# Altium footprint library domino-rising-cage-clamp.PcbLib: 435 footprints (part 10 of 28)
Each footprint in its own frame and in the unit in brackets; x right, y up, seen from the top. Pads: shape width x height; smd on the part's side, far side on the other; paste and mask are expansions set on the pad; w line width, h text height; cw(c..) or ccw(c..) is an arc to the next point about the centre after c.
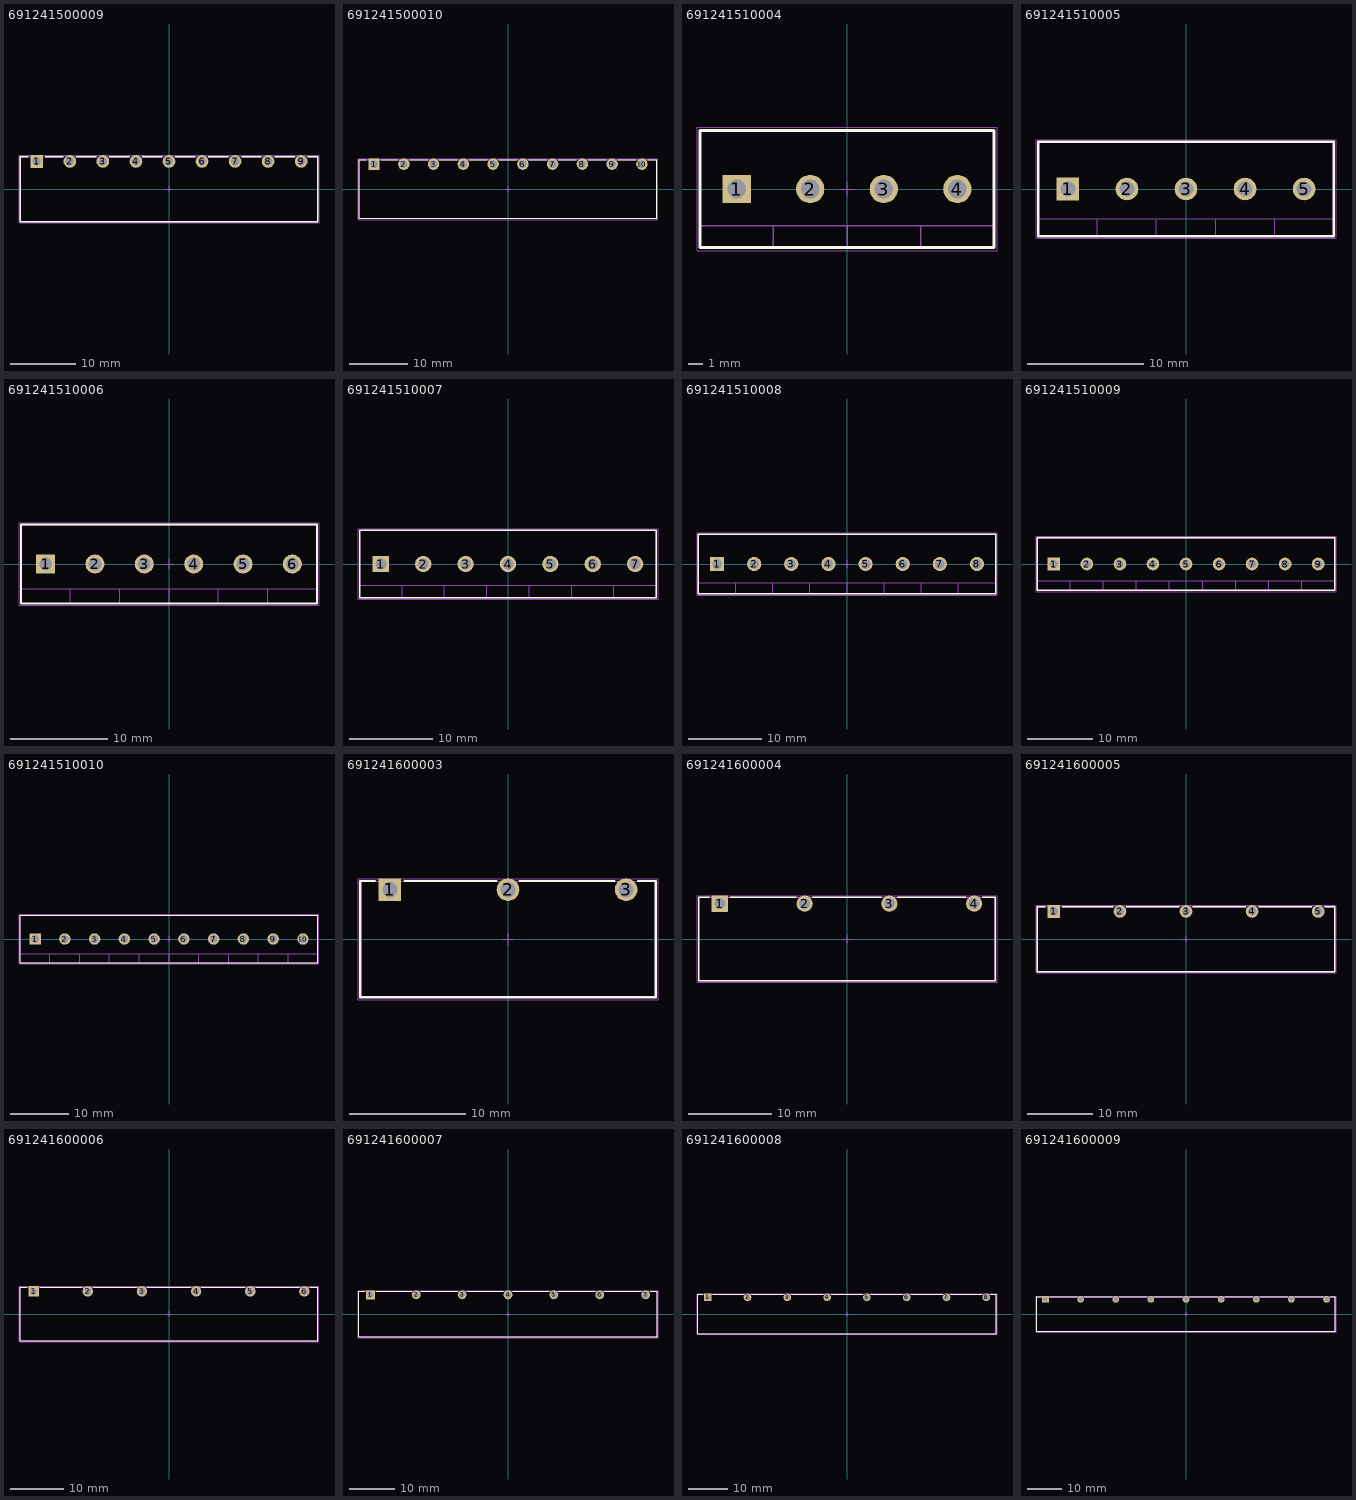
[diagram p9: the footprints below, top view; thin cyan lines are the x and y axes]

## 691241500009 [mm] "Serie 2415-5.08mm Vertical Cable Entry with Rising Cage Clamp, 9 pins"
height 8.1
pads (9):
  rect 1.95x1.95 hole 1.3: 1(-20.325,4.25)
  round 1.95 hole 1.3: 2(-15.245,4.25) 3(-10.165,4.25) 4(-5.085,4.25) 5(-0.005,4.25) 6(5.075,4.25) 7(10.155,4.25) 8(15.235,4.25) 9(20.315,4.25)
Top Overlay:
  lines w0.2: -21.61,5 -22.86,5 -22.86,-5 22.86,-5 22.86,5 21.31,5 ; -19.06,5 -16.26,5 ; -14.23,5 -11.16,5 ; -9.17,5 -6.1,5 ; -4.09,5 -1.02,5 ; 0.99,5 4.06,5 ; 6.07,5 9.14,5 ; 11.15,5 14.22,5 ; 16.23,5 19.3,5
Mechanical 13:
  lines w0.1: -22.86,-5 -22.86,5 22.86,5 22.86,-5 -22.86,-5
Mechanical 15:
  lines w0.05: -0.5,0 0.5,0 ; 0,-0.5 0,0.5 ; -23.06,-5.2 23.06,-5.2 23.06,5.2 -23.06,5.2 -23.06,-5.2
3D body "691241500009.stp": height 8.2, standoff -3.4, extent -22.865,-5 22.855,5

## 691241500010 [mm] "Serie 2415-5.08mm Vertical Cable Entry with Rising Cage Clamp, 10 pins"
height 8.1
pads (10):
  rect 1.95x1.95 hole 1.3: 1(-22.865,4.25)
  round 1.95 hole 1.3: 2(-17.785,4.25) 3(-12.705,4.25) 4(-7.625,4.25) 5(-2.545,4.25) 6(2.535,4.25) 7(7.615,4.25) 8(12.695,4.25) 9(17.775,4.25) 10(22.855,4.25)
Top Overlay:
  lines w0.2: -24.15,5 -25.4,5 -25.4,-5 25.4,-5 25.4,5 23.85,5 ; -21.6,5 -18.8,5 ; -16.77,5 -13.7,5 ; -11.71,5 -8.64,5 ; -6.63,5 -3.56,5 ; -1.55,5 1.52,5 ; 3.53,5 6.6,5 ; 8.61,5 11.68,5 ; 13.69,5 16.76,5 ; 18.77,5 21.84,5
Mechanical 13:
  lines w0.1: -25.4,-5 25.4,-5 25.4,5 -25.4,5 -25.4,-5
Mechanical 15:
  lines w0.05: -0.5,0 0.5,0 ; 0,-0.5 0,0.5 ; -25.6,-5.2 -25.6,5.2 25.6,5.2 25.6,-5.2 -25.6,-5.2
3D body "691241500010.stp": height 8.2, standoff -3.4, extent -25.405,-5 25.395,5

## 691241510004 [mm] "Serie 2415 - 5.08 mm _ 4 pins"
height 10
pads (4):
  rect 1.95x1.95 hole 1.3: 1(-7.62,0)
  round 1.95 hole 1.3: 2(-2.54,0) 3(2.54,0) 4(7.62,0)
Top Overlay:
  lines w0.2: -10.16,-4.05 -10.16,4.05 10.16,4.05 10.16,-4.05 -10.16,-4.05
Mechanical 13:
  lines w0.1: -10.16,-2.55 10.16,-2.55 ; -5.08,-4.05 -5.08,-2.55 ; 0,-4.05 0,-2.55 ; 5.08,-4.05 5.08,-2.55 ; -10.16,-4.05 10.16,-4.05 10.16,4.05 -10.16,4.05 -10.16,-4.05
Mechanical 15:
  lines w0.05: -0.5,0 0.5,0 ; 0,-0.5 0,0.5 ; -10.36,-4.25 -10.36,4.25 10.36,4.25 10.36,-4.25 -10.36,-4.25
3D body "691241510004.stp": height 10.05, standoff -3.45, extent -10.16,-4.05 10.16,4.05

## 691241510005 [mm] "Serie 2415 - 5.08 mm _ 5 pins"
height 10
pads (5):
  rect 1.95x1.95 hole 1.3: 1(-10.16,0)
  round 1.95 hole 1.3: 2(-5.08,0) 3(0,0) 4(5.08,0) 5(10.16,0)
Top Overlay:
  lines w0.2: -12.7,-4.05 12.7,-4.05 12.7,4.05 -12.7,4.05 -12.7,-4.05
Mechanical 13:
  lines w0.1: -12.7,-2.55 12.7,-2.55 ; -7.62,-4.05 -7.62,-2.55 ; -2.54,-4.05 -2.54,-2.55 ; 2.54,-4.05 2.54,-2.55 ; 7.62,-4.05 7.62,-2.55 ; -12.7,-4.05 -12.7,4.05 12.7,4.05 12.7,-4.05 -12.7,-4.05
Mechanical 15:
  lines w0.05: -0.5,0 0.5,0 ; 0,-0.5 0,0.5 ; -12.9,-4.25 12.9,-4.25 12.9,4.25 -12.9,4.25 -12.9,-4.25
3D body "691241510005.stp": height 10.05, standoff -3.45, extent -12.7,-4.05 12.7,4.05

## 691241510006 [mm] "Serie 2415 - 5.08 mm _ 6 pins"
height 10
pads (6):
  rect 1.95x1.95 hole 1.3: 1(-12.7,0)
  round 1.95 hole 1.3: 2(-7.62,0) 3(-2.54,0) 4(2.54,0) 5(7.62,0) 6(12.7,0)
Top Overlay:
  lines w0.2: -15.24,-4.05 -15.24,4.05 15.24,4.05 15.24,-4.05 -15.24,-4.05
Mechanical 13:
  lines w0.1: -15.24,-2.55 15.24,-2.55 ; -10.16,-4.05 -10.16,-2.55 ; -5.08,-4.05 -5.08,-2.55 ; 0,-4.05 0,-2.55 ; 5.08,-4.05 5.08,-2.55 ; 10.16,-4.04 10.16,-2.54 ; -15.24,-4.05 15.24,-4.05 15.24,4.05 -15.24,4.05 -15.24,-4.05
Mechanical 15:
  lines w0.05: -0.5,0 0.5,0 ; 0,-0.5 0,0.5 ; -15.44,-4.25 -15.44,4.25 15.44,4.25 15.44,-4.25 -15.44,-4.25
3D body "691241510006.stp": height 10.05, standoff -3.45, extent -15.24,-4.05 15.24,4.05

## 691241510007 [mm] "Serie 2415 - 5.08 mm _ 7 pins"
height 10
pads (7):
  rect 1.95x1.95 hole 1.3: 1(-15.24,0)
  round 1.95 hole 1.3: 2(-10.16,0) 3(-5.08,0) 4(0,0) 5(5.08,0) 6(10.16,0) 7(15.24,0)
Top Overlay:
  lines w0.2: -17.78,-4.05 17.78,-4.05 17.78,4.05 -17.78,4.05 -17.78,-4.05
Mechanical 13:
  lines w0.1: -17.78,-2.55 17.78,-2.55 ; -12.7,-4.05 -12.7,-2.55 ; -7.62,-4.05 -7.62,-2.55 ; -2.54,-4.05 -2.54,-2.55 ; 2.54,-4.05 2.54,-2.55 ; 7.62,-4.04 7.62,-2.54 ; 12.7,-4.04 12.7,-2.54 ; -17.78,-4.05 -17.78,4.05 17.78,4.05 17.78,-4.05 -17.78,-4.05
Mechanical 15:
  lines w0.05: -0.5,0 0.5,0 ; 0,-0.5 0,0.5 ; -17.98,-4.25 17.98,-4.25 17.98,4.25 -17.98,4.25 -17.98,-4.25
3D body "691241510007.stp": height 10.05, standoff -3.45, extent -17.78,-4.05 17.78,4.05

## 691241510008 [mm] "Serie 2415 - 5.08 mm _ 8 pins"
height 10
pads (8):
  rect 1.95x1.95 hole 1.3: 1(-17.78,0)
  round 1.95 hole 1.3: 2(-12.7,0) 3(-7.62,0) 4(-2.54,0) 5(2.54,0) 6(7.62,0) 7(12.7,0) 8(17.78,0)
Top Overlay:
  lines w0.2: -20.32,-4.05 -20.32,4.05 20.32,4.05 20.32,-4.05 -20.32,-4.05
Mechanical 13:
  lines w0.1: -20.32,-2.55 20.32,-2.55 ; -15.24,-4.05 -15.24,-2.55 ; -10.16,-4.05 -10.16,-2.55 ; -5.08,-4.05 -5.08,-2.55 ; 0,-4.05 0,-2.55 ; 5.08,-4.04 5.08,-2.54 ; 10.16,-4.04 10.16,-2.54 ; 15.24,-4.04 15.24,-2.54 ; -20.32,-4.05 20.32,-4.05 20.32,4.05 -20.32,4.05 -20.32,-4.05
Mechanical 15:
  lines w0.05: -0.5,0 0.5,0 ; 0,-0.5 0,0.5 ; -20.52,-4.25 -20.52,4.25 20.52,4.25 20.52,-4.25 -20.52,-4.25
3D body "691241510008.stp": height 10.05, standoff -3.45, extent -20.32,-4.05 20.32,4.05

## 691241510009 [mm] "Serie 2415 - 5.08 mm _ 9 pins"
height 10
pads (9):
  rect 1.95x1.95 hole 1.3: 1(-20.32,0)
  round 1.95 hole 1.3: 2(-15.24,0) 3(-10.16,0) 4(-5.08,0) 5(0,0) 6(5.08,0) 7(10.16,0) 8(15.24,0) 9(20.32,0)
Top Overlay:
  lines w0.2: -22.86,-4.05 22.86,-4.05 22.86,4.05 -22.86,4.05 -22.86,-4.05
Mechanical 13:
  lines w0.1: -22.86,-2.55 22.86,-2.55 ; -17.78,-4.05 -17.78,-2.55 ; -12.7,-4.05 -12.7,-2.55 ; -7.62,-4.05 -7.62,-2.55 ; -2.54,-4.05 -2.54,-2.55 ; 2.54,-4.04 2.54,-2.54 ; 7.62,-4.04 7.62,-2.54 ; 12.7,-4.04 12.7,-2.54 ; 17.78,-4.04 17.78,-2.54 ; -22.86,-4.05 -22.86,4.05 22.86,4.05 22.86,-4.05 -22.86,-4.05
Mechanical 15:
  lines w0.05: -0.5,0 0.5,0 ; 0,-0.5 0,0.5 ; -23.06,-4.25 23.06,-4.25 23.06,4.25 -23.06,4.25 -23.06,-4.25
3D body "691241510009.stp": height 10.05, standoff -3.45, extent -22.86,-4.05 22.86,4.05

## 691241510010 [mm] "Serie 2415 - 5.08 mm _ 10 pins"
height 10
pads (10):
  rect 1.95x1.95 hole 1.3: 1(-22.86,0)
  round 1.95 hole 1.3: 2(-17.78,0) 3(-12.7,0) 4(-7.62,0) 5(-2.54,0) 6(2.54,0) 7(7.62,0) 8(12.7,0) 9(17.78,0) 10(22.86,0)
Top Overlay:
  lines w0.2: -25.4,-4.05 -25.4,4.05 25.4,4.05 25.4,-4.05 -25.4,-4.05
Mechanical 13:
  lines w0.1: -25.4,-2.55 25.4,-2.55 ; -20.32,-4.05 -20.32,-2.55 ; -15.24,-4.05 -15.24,-2.55 ; -10.16,-4.05 -10.16,-2.55 ; -5.08,-4.05 -5.08,-2.55 ; 0,-4.04 0,-2.54 ; 5.08,-4.04 5.08,-2.54 ; 10.16,-4.04 10.16,-2.54 ; 15.24,-4.04 15.24,-2.54 ; 20.32,-4.04 20.32,-2.54 ; -25.4,-4.05 25.4,-4.05 25.4,4.05 -25.4,4.05 -25.4,-4.05
Mechanical 15:
  lines w0.05: -0.5,0 0.5,0 ; 0,-0.5 0,0.5 ; -25.6,-4.25 -25.6,4.25 25.6,4.25 25.6,-4.25 -25.6,-4.25
3D body "691241510010.stp": height 10.05, standoff -3.45, extent -25.4,-4.05 25.4,4.05

## 691241600003 [mm] "Vertical Cable Entry with Rising Cage Clamp, pitch 10.16mm, 03p"
height 8.1
pads (3):
  rect 1.95x1.95 hole 1.3: 1(-10.16,4.25)
  round 1.95 hole 1.3: 2(0,4.25) 3(10.16,4.25)
Top Overlay:
  lines w0.2: -11.45,5 -12.7,5 -12.7,-5 12.7,-5 12.7,5 11.2,5 ; -8.9,5 -1,5 ; 1,5 9.15,5
Mechanical 13:
  lines w0.1: -12.7,-5 12.7,-5 12.7,5 -12.7,5 -12.7,-5
Mechanical 15:
  lines w0.05: -0.5,0 0.5,0 ; 0,-0.5 0,0.5 ; -12.9,-5.2 12.9,-5.2 12.9,5.2 -12.9,5.2 -12.9,-5.2
3D body "691241600003.stp": height 8.2, standoff -3.4, extent -12.7,-5 12.7,5

## 691241600004 [mm] "Vertical Cable Entry with Rising Cage Clamp, pitch 10.16mm, 04p"
height 8.1
pads (4):
  rect 1.95x1.95 hole 1.3: 1(-15.24,4.25)
  round 1.95 hole 1.3: 2(-5.08,4.25) 3(5.08,4.25) 4(15.24,4.25)
Top Overlay:
  lines w0.2: -16.53,5 -17.78,5 -17.78,-5 17.78,-5 17.78,5 16.28,5 ; -13.98,5 -6.08,5 ; -4.08,5 4.07,5 ; 6.08,5 14.23,5
Mechanical 13:
  lines w0.1: -17.78,-5 -17.78,5 17.78,5 17.78,-5 -17.78,-5
Mechanical 15:
  lines w0.05: -0.5,0 0.5,0 ; 0,-0.5 0,0.5 ; -17.98,-5.2 -17.98,5.2 17.98,5.2 17.98,-5.2 -17.98,-5.2
3D body "691241600004.stp": height 8.2, standoff -3.4, extent -17.78,-5 17.78,5

## 691241600005 [mm] "Vertical Cable Entry with Rising Cage Clamp, pitch 10.16mm, 05p"
height 8.1
pads (5):
  rect 1.95x1.95 hole 1.3: 1(-20.32,4.25)
  round 1.95 hole 1.3: 2(-10.16,4.25) 3(0,4.25) 4(10.16,4.25) 5(20.32,4.25)
Top Overlay:
  lines w0.2: -21.61,5 -22.86,5 -22.86,-5 22.86,-5 22.86,5 21.36,5 ; -19.06,5 -11.16,5 ; -9.16,5 -1.01,5 ; 1,5 9.15,5 ; 11.16,5 19.31,5
Mechanical 13:
  lines w0.1: -22.86,-5 22.86,-5 22.86,5 -22.86,5 -22.86,-5
Mechanical 15:
  lines w0.05: -0.5,0 0.5,0 ; 0,-0.5 0,0.5 ; -23.06,-5.2 23.06,-5.2 23.06,5.2 -23.06,5.2 -23.06,-5.2
3D body "691241600005.stp": height 8.2, standoff -3.4, extent -22.86,-5 22.86,5

## 691241600006 [mm] "Vertical Cable Entry with Rising Cage Clamp, pitch 10.16mm, 06p"
height 8.1
pads (6):
  rect 1.95x1.95 hole 1.3: 1(-25.4,4.25)
  round 1.95 hole 1.3: 2(-15.24,4.25) 3(-5.08,4.25) 4(5.08,4.25) 5(15.24,4.25) 6(25.4,4.25)
Top Overlay:
  lines w0.2: -26.69,5 -27.94,5 -27.94,-5 27.94,-5 27.94,5 26.44,5 ; -24.14,5 -16.24,5 ; -14.24,5 -6.09,5 ; -4.08,5 4.07,5 ; 6.08,5 14.23,5 ; 16.24,5 24.39,5
Mechanical 13:
  lines w0.1: -27.94,-5 27.94,-5 27.94,5 -27.94,5 -27.94,-5
Mechanical 15:
  lines w0.05: -0.5,0 0.5,0 ; 0,-0.5 0,0.5 ; -28.14,-5.2 28.14,-5.2 28.14,5.2 -28.14,5.2 -28.14,-5.2
3D body "691241600006.stp": height 8.2, standoff -3.4, extent -27.94,-5 27.94,5

## 691241600007 [mm] "Vertical Cable Entry with Rising Cage Clamp, pitch 10.16mm, 07p"
height 8.1
pads (7):
  rect 1.95x1.95 hole 1.3: 1(-30.48,4.25)
  round 1.95 hole 1.3: 2(-20.32,4.25) 3(-10.16,4.25) 4(0,4.25) 5(10.16,4.25) 6(20.32,4.25) 7(30.48,4.25)
Top Overlay:
  lines w0.2: -31.77,5 -33.02,5 -33.02,-5 33.02,-5 33.02,5 31.52,5 ; -29.22,5 -21.32,5 ; -19.32,5 -11.17,5 ; -9.16,5 -1.01,5 ; 1,5 9.15,5 ; 11.16,5 19.31,5 ; 21.32,5 29.47,5
Mechanical 13:
  lines w0.1: -33.02,-5 -33.02,5 33.02,5 33.02,-5 -33.02,-5
Mechanical 15:
  lines w0.05: -0.5,0 0.5,0 ; 0,-0.5 0,0.5 ; -33.22,-5.2 -33.22,5.2 33.22,5.2 33.22,-5.2 -33.22,-5.2
3D body "691241600007.stp": height 8.2, standoff -3.4, extent -33.02,-5 33.02,5

## 691241600008 [mm] "Vertical Cable Entry with Rising Cage Clamp, pitch 10.16mm, 08p"
height 8.1
pads (8):
  rect 1.95x1.95 hole 1.3: 1(-35.56,4.25)
  round 1.95 hole 1.3: 2(-25.4,4.25) 3(-15.24,4.25) 4(-5.08,4.25) 5(5.08,4.25) 6(15.24,4.25) 7(25.4,4.25) 8(35.56,4.25)
Top Overlay:
  lines w0.2: -36.85,5 -38.1,5 -38.1,-5 38.1,-5 38.1,5 36.6,5 ; -34.3,5 -26.4,5 ; -24.4,5 -16.25,5 ; -14.24,5 -6.09,5 ; -4.08,5 4.07,5 ; 6.08,5 14.23,5 ; 16.24,5 24.39,5 ; 26.4,5 34.55,5
Mechanical 13:
  lines w0.1: -38.1,-5 38.1,-5 38.1,5 -38.1,5 -38.1,-5
Mechanical 15:
  lines w0.05: -0.5,0 0.5,0 ; 0,-0.5 0,0.5 ; -38.3,-5.2 38.3,-5.2 38.3,5.2 -38.3,5.2 -38.3,-5.2
3D body "691241600008.stp": height 8.2, standoff -3.4, extent -38.1,-5 38.1,5

## 691241600009 [mm] "Vertical Cable Entry with Rising Cage Clamp, pitch 10.16mm, 09p"
height 8.1
pads (9):
  rect 1.95x1.95 hole 1.3: 1(-40.64,4.25)
  round 1.95 hole 1.3: 2(-30.48,4.25) 3(-20.32,4.25) 4(-10.16,4.25) 5(0,4.25) 6(10.16,4.25) 7(20.32,4.25) 8(30.48,4.25) 9(40.64,4.25)
Top Overlay:
  lines w0.2: -41.93,5 -43.18,5 -43.18,-5 43.18,-5 43.18,5 41.68,5 ; -39.38,5 -31.48,5 ; -29.48,5 -21.33,5 ; -19.32,5 -11.17,5 ; -9.16,5 -1.01,5 ; 1,5 9.15,5 ; 11.16,5 19.31,5 ; 21.32,5 29.47,5 ; 31.48,5 39.63,5
Mechanical 13:
  lines w0.1: -43.18,-5 43.18,-5 43.18,5 -43.18,5 -43.18,-5
Mechanical 15:
  lines w0.05: -0.5,0 0.5,0 ; 0,-0.5 0,0.5 ; -43.38,-5.2 43.38,-5.2 43.38,5.2 -43.38,5.2 -43.38,-5.2
3D body "691241600009.stp": height 8.2, standoff -3.4, extent -43.18,-5 43.18,5